# Altium footprint library PcbLib_ICs.PcbLib: 317 footprints (part 24 of 24)
Each footprint in its own frame and in the unit in brackets; x right, y up, seen from the top. Pads: shape width x height; smd on the part's side, far side on the other; paste and mask are expansions set on the pad; w line width, h text height; cw(c..) or ccw(c..) is an arc to the next point about the centre after c.
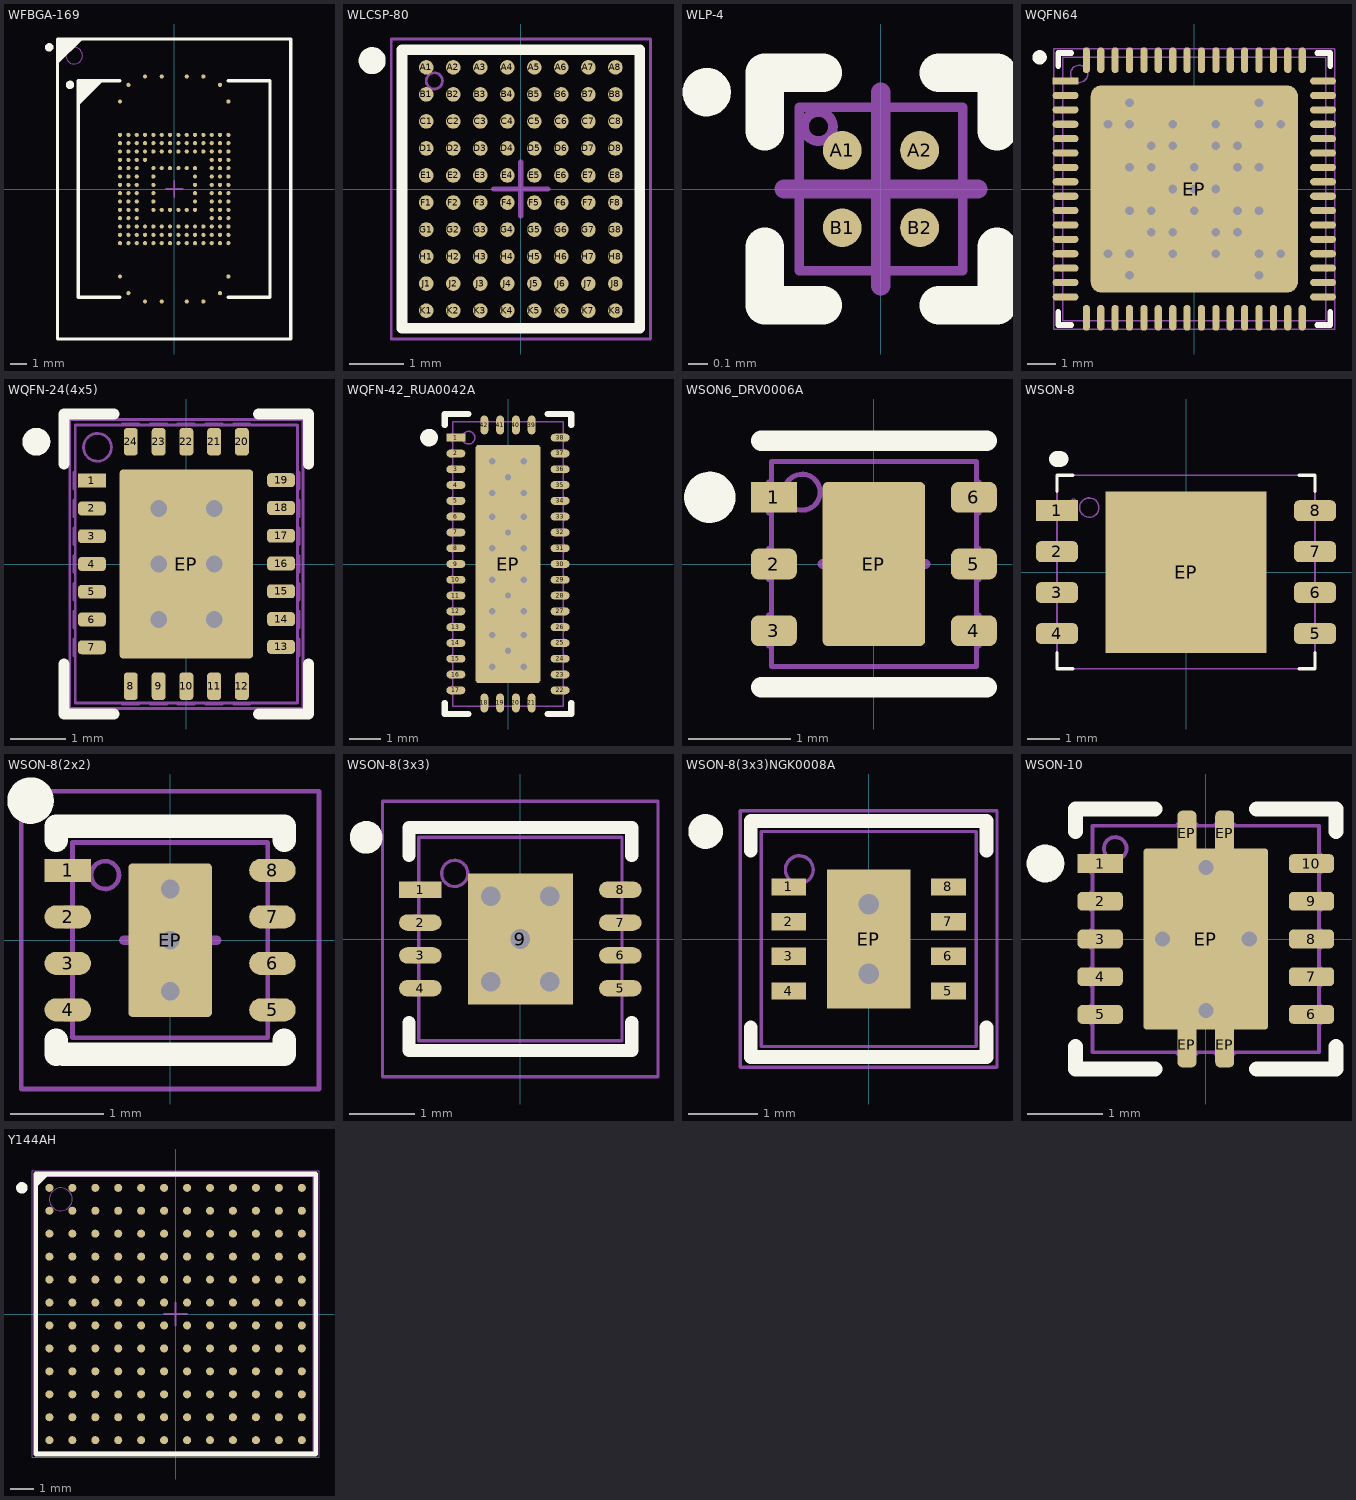
[diagram p23: the footprints below, top view; thin cyan lines are the x and y axes]

## WFBGA-169 [mm] "WFBGA-169, 169-Leads, Body 11.00x11.00mmx3.50mm, Pitch 0.50mm"
height 3.5
pads (169):
  round 0.25 smd mask+0.05: A4(-1.75,6.75) A6(-0.75,6.75) A9(0.75,6.75) A11(1.75,6.75) AA1(-3.25,-3.25) AA2(-2.75,-3.25) AA3(-2.25,-3.25) AA4(-1.75,-3.25) AA5(-1.25,-3.25) AA6(-0.75,-3.25) AA7(-0.25,-3.25) AA8(0.25,-3.25) AA9(0.75,-3.25) AA10(1.25,-3.25) AA11(1.75,-3.25) AA12(2.25,-3.25) AA13(2.75,-3.25) AA14(3.25,-3.25) AE1(-3.25,-5.25) AE14(3.25,-5.25) AG2(-2.75,-6.25) AG13(2.75,-6.25) AH4(-1.75,-6.75) AH6(-0.75,-6.75) AH9(0.75,-6.75) AH11(1.75,-6.75) B2(-2.75,6.25) B13(2.75,6.25) D1(-3.25,5.25) D14(3.25,5.25) H1(-3.25,3.25) H2(-2.75,3.25) H3(-2.25,3.25) H4(-1.75,3.25) H5(-1.25,3.25) H6(-0.75,3.25) H7(-0.25,3.25) H8(0.25,3.25) H9(0.75,3.25) H10(1.25,3.25) H11(1.75,3.25) H12(2.25,3.25) H13(2.75,3.25) H14(3.25,3.25) J1(-3.25,2.75) J2(-2.75,2.75) J3(-2.25,2.75) J4(-1.75,2.75) J5(-1.25,2.75) J6(-0.75,2.75) J7(-0.25,2.75) J8(0.25,2.75) J9(0.75,2.75) J10(1.25,2.75) J11(1.75,2.75) J12(2.25,2.75) J13(2.75,2.75) J14(3.25,2.75) K1(-3.25,2.25) K2(-2.75,2.25) K3(-2.25,2.25) K4(-1.75,2.25) K5(-1.25,2.25) K6(-0.75,2.25) K7(-0.25,2.25) K8(0.25,2.25) K9(0.75,2.25) K10(1.25,2.25) K11(1.75,2.25) K12(2.25,2.25) K13(2.75,2.25) K14(3.25,2.25) L1(-3.25,1.75) L2(-2.75,1.75) L3(-2.25,1.75) L4(-1.75,1.75) L12(2.25,1.75) L13(2.75,1.75) L14(3.25,1.75) M1(-3.25,1.25) M2(-2.75,1.25) M3(-2.25,1.25) M5(-1.25,1.25) M6(-0.75,1.25) M7(-0.25,1.25) M8(0.25,1.25) M9(0.75,1.25) M10(1.25,1.25) M12(2.25,1.25) M13(2.75,1.25) M14(3.25,1.25) N1(-3.25,0.75) N2(-2.75,0.75) N3(-2.25,0.75) N5(-1.25,0.75) N10(1.25,0.75) N12(2.25,0.75) N13(2.75,0.75) N14(3.25,0.75) P1(-3.25,0.25) P2(-2.75,0.25) P3(-2.25,0.25) P5(-1.25,0.25) P10(1.25,0.25) P12(2.25,0.25) P13(2.75,0.25) P14(3.25,0.25) R1(-3.25,-0.25) R2(-2.75,-0.25) R3(-2.25,-0.25) R5(-1.25,-0.25) R10(1.25,-0.25) R12(2.25,-0.25) R13(2.75,-0.25) R14(3.25,-0.25) T1(-3.25,-0.75) T2(-2.75,-0.75) T3(-2.25,-0.75) T5(-1.25,-0.75) T10(1.25,-0.75) T12(2.25,-0.75) T13(2.75,-0.75) T14(3.25,-0.75) U1(-3.25,-1.25) U2(-2.75,-1.25) U3(-2.25,-1.25) U5(-1.25,-1.25) U6(-0.75,-1.25) U7(-0.25,-1.25) U8(0.25,-1.25) U9(0.75,-1.25) U10(1.25,-1.25) U12(2.25,-1.25) U13(2.75,-1.25) U14(3.25,-1.25) V1(-3.25,-1.75) V2(-2.75,-1.75) V3(-2.25,-1.75) V12(2.25,-1.75) V13(2.75,-1.75) V14(3.25,-1.75) W1(-3.25,-2.25) W2(-2.75,-2.25) W3(-2.25,-2.25) W4(-1.75,-2.25) W5(-1.25,-2.25) W6(-0.75,-2.25) W7(-0.25,-2.25) W8(0.25,-2.25) W9(0.75,-2.25) W10(1.25,-2.25) W11(1.75,-2.25) W12(2.25,-2.25) W13(2.75,-2.25) W14(3.25,-2.25) Y1(-3.25,-2.75) Y2(-2.75,-2.75) Y3(-2.25,-2.75) Y4(-1.75,-2.75) Y5(-1.25,-2.75) Y6(-0.75,-2.75) Y7(-0.25,-2.75) Y8(0.25,-2.75) Y9(0.75,-2.75) Y10(1.25,-2.75) Y11(1.75,-2.75) Y12(2.25,-2.75) Y13(2.75,-2.75) Y14(3.25,-2.75)
Top Overlay:
  circle w0.25: c-7.5,8.5 r0.125
  circle w0.25: c-6.25,6.25 r0.125
  region: -5.75,6.5 -5.75,5 -4.25,6.5
  region: -7,9 -7,7.5 -5.5,9
  lines w0.2: -3.25,-6.5 -5.75,-6.5 -5.75,6.5 -3.25,6.5 ; 3.25,-6.5 5.75,-6.5 5.75,6.5 3.25,6.5 ; -7,-9 7,-9 7,9 -7,9 -7,-9
Top Assy:
  circle w0.05: c-6,8 r0.5
  lines w0.05: -7,-9 -7,9 7,9 7,-9 -7,-9
  text ".Designator" at -2.579,-0.349 h1.5
Top Text:
  lines w0.1: -0.5,0 0.5,0 ; 0,-0.5 0,0.5
3D body "WFBGA-169.STEP": height 1, standoff 0, extent -7,-9 7,9

## WLCSP-80 [mm] "WLCSP-80 package with 0.5mm pitch (Analog Devices Package Option CB-80-5 )"
height 0.66
pads (80):
  round 0.27 smd paste+0 mask+0.08: A1(-1.75,2.25) A2(-1.25,2.25) A3(-0.75,2.25) A4(-0.25,2.25) A5(0.25,2.25) A6(0.75,2.25) A7(1.25,2.25) A8(1.75,2.25) B1(-1.75,1.75) B2(-1.25,1.75) B3(-0.75,1.75) B4(-0.25,1.75) B5(0.25,1.75) B6(0.75,1.75) B7(1.25,1.75) B8(1.75,1.75) C1(-1.75,1.25) C2(-1.25,1.25) C3(-0.75,1.25) C4(-0.25,1.25) C5(0.25,1.25) C6(0.75,1.25) C7(1.25,1.25) C8(1.75,1.25) D1(-1.75,0.75) D2(-1.25,0.75) D3(-0.75,0.75) D4(-0.25,0.75) D5(0.25,0.75) D6(0.75,0.75) D7(1.25,0.75) D8(1.75,0.75) E1(-1.75,0.25) E2(-1.25,0.25) E3(-0.75,0.25) E4(-0.25,0.25) E5(0.25,0.25) E6(0.75,0.25) E7(1.25,0.25) E8(1.75,0.25) F1(-1.75,-0.25) F2(-1.25,-0.25) F3(-0.75,-0.25) F4(-0.25,-0.25) F5(0.25,-0.25) F6(0.75,-0.25) F7(1.25,-0.25) F8(1.75,-0.25) G1(-1.75,-0.75) G2(-1.25,-0.75) G3(-0.75,-0.75) G4(-0.25,-0.75) G5(0.25,-0.75) G6(0.75,-0.75) G7(1.25,-0.75) G8(1.75,-0.75) H1(-1.75,-1.25) H2(-1.25,-1.25) H3(-0.75,-1.25) H4(-0.25,-1.25) H5(0.25,-1.25) H6(0.75,-1.25) H7(1.25,-1.25) H8(1.75,-1.25) J1(-1.75,-1.75) J2(-1.25,-1.75) J3(-0.75,-1.75) J4(-0.25,-1.75) J5(0.25,-1.75) J6(0.75,-1.75) J7(1.25,-1.75) J8(1.75,-1.75) K1(-1.75,-2.25) K2(-1.25,-2.25) K3(-0.75,-2.25) K4(-0.25,-2.25) K5(0.25,-2.25) K6(0.75,-2.25) K7(1.25,-2.25) K8(1.75,-2.25)
Top Overlay:
  circle w0.25: c-2.75,2.375 r0.125
  lines w0.2: -2.2,-2.575 2.2,-2.575 2.2,2.575 -2.2,2.575 -2.2,-2.575
Top Assy:
  circle w0.05: c-1.6,2 r0.15
  lines w0.05: -2.145,-2.52 2.145,-2.52 2.145,2.52 -2.145,2.52 -2.145,-2.52
  text ".Designator" at -3.443,-0.467 h2
Top Text:
  lines w0.05: -2.4,-2.775 2.4,-2.775 2.4,2.775 -2.4,2.775 -2.4,-2.775
  lines w0.1: -0.5,0 0.5,0 ; 0,-0.5 0,0.5
3D body "WLCSP-80.step": height 0.66, standoff 0, extent -2.145,-2.52 2.145,2.52

## WLP-4 [mm] "CLG400 Package for Zynq-7000 Series SoC"
height 1.6
pads (4):
  round 0.2 smd paste+0 mask+0.05: A1(-0.2,0.2) A2(0.2,0.2) B1(-0.2,-0.2) B2(0.2,-0.2)
Top Overlay:
  circle w0.15: c-0.9,0.5 r0.05
  lines w0.2: -0.6,-0.3 -0.6,-0.6 -0.3,-0.6 ; -0.6,0.3 -0.6,0.6 -0.3,0.6 ; 0.3,-0.6 0.6,-0.6 0.6,-0.3 ; 0.3,0.6 0.6,0.6 0.6,0.3
Top Assy:
  circle w0.05: c-0.322,0.323 r0.075
  lines w0.05: -0.422,-0.422 -0.422,0.423 0.423,0.423 0.423,-0.422 -0.422,-0.422
  text ".Designator" at -1.204,-0.163 h0.7
Top Text:
  lines w0.1: -0.5,0 0.5,0 ; 0,-0.5 0,0.5
3D body "WLP-4.STEP": height 0.31, standoff -0.04, extent -0.422,-0.422 0.422,0.422

## WQFN64 [mm] "QFN64 9mm x 9mm, 0.5mm pitch, EPAD 7.2x7.2mm"
height 1
pads (65):
  rect 0.9x0.25 smd paste+0 mask+0.05: 1(-4.475,3.75)
  oval 0.9x0.25 smd paste+0 mask+0.05: 2(-4.475,3.25) 3(-4.475,2.75) 4(-4.475,2.25) 5(-4.475,1.75) 6(-4.475,1.25) 7(-4.475,0.75) 8(-4.475,0.25) 9(-4.475,-0.25) 10(-4.475,-0.75) 11(-4.475,-1.25) 12(-4.475,-1.75) 13(-4.475,-2.25) 14(-4.475,-2.75) 15(-4.475,-3.25) 16(-4.475,-3.75) 33(4.475,-3.75) 34(4.475,-3.25) 35(4.475,-2.75) 36(4.475,-2.25) 37(4.475,-1.75) 38(4.475,-1.25) 39(4.475,-0.75) 40(4.475,-0.25) 41(4.475,0.25) 42(4.475,0.75) 43(4.475,1.25) 44(4.475,1.75) 45(4.475,2.25) 46(4.475,2.75) 47(4.475,3.25) 48(4.475,3.75)
  oval 0.25x0.9 smd paste+0 mask+0.05: 17(-3.75,-4.475) 18(-3.25,-4.475) 19(-2.75,-4.475) 20(-2.25,-4.475) 21(-1.75,-4.475) 22(-1.25,-4.475) 23(-0.75,-4.475) 24(-0.25,-4.475) 25(0.25,-4.475) 26(0.75,-4.475) 27(1.25,-4.475) 28(1.75,-4.475) 29(2.25,-4.475) 30(2.75,-4.475) 31(3.25,-4.475) 32(3.75,-4.475) 49(3.75,4.475) 50(3.25,4.475) 51(2.75,4.475) 52(2.25,4.475) 53(1.75,4.475) 54(1.25,4.475) 55(0.75,4.475) 56(0.25,4.475) 57(-0.25,4.475) 58(-0.75,4.475) 59(-1.25,4.475) 60(-1.75,4.475) 61(-2.25,4.475) 62(-2.75,4.475) 63(-3.25,4.475) 64(-3.75,4.475)
  rrect10% 7.2x7.2 smd paste-50 mask+0.05: EP(0,0)
via -3,-2.25 diameter 0.7 hole 0.3
via -2.25,-3 diameter 0.7 hole 0.3
via 2.25,-3 diameter 0.7 hole 0.3
via 3,-2.25 diameter 0.7 hole 0.3
via 3,2.25 diameter 0.7 hole 0.3
via 2.25,3 diameter 0.7 hole 0.3
via -2.25,3 diameter 0.7 hole 0.3
via -3,2.25 diameter 0.7 hole 0.3
via -1.5,1.5 diameter 0.7 hole 0.3
via -0.75,1.5 diameter 0.7 hole 0.3
via 0.75,1.5 diameter 0.7 hole 0.3
via 1.5,0.75 diameter 0.7 hole 0.3
via 1.5,-0.75 diameter 0.7 hole 0.3
via 0.75,-1.5 diameter 0.7 hole 0.3
via -0.75,-1.5 diameter 0.7 hole 0.3
via 0,0 diameter 0.7 hole 0.3
via 1.5,1.5 diameter 0.7 hole 0.3
via 2.25,2.25 diameter 0.7 hole 0.3
via 0.75,2.25 diameter 0.7 hole 0.3
via 2.25,0.75 diameter 0.7 hole 0.3
via 1.5,-1.5 diameter 0.7 hole 0.3
via 2.25,-2.25 diameter 0.7 hole 0.3
via 2.25,-0.75 diameter 0.7 hole 0.3
via 0.75,-2.25 diameter 0.7 hole 0.3
via -1.5,-1.5 diameter 0.7 hole 0.3
via -2.25,-2.25 diameter 0.7 hole 0.3
via -0.75,-2.25 diameter 0.7 hole 0.3
via -2.25,-0.75 diameter 0.7 hole 0.3
via -2.25,2.25 diameter 0.7 hole 0.3
via -0.75,2.25 diameter 0.7 hole 0.3
via -2.25,0.75 diameter 0.7 hole 0.3
via -1.5,-0.75 diameter 0.7 hole 0.3
via -1.5,0.75 diameter 0.7 hole 0.3
via -0.75,0 diameter 0.7 hole 0.3
via 0,0.75 diameter 0.7 hole 0.3
via 0.75,0 diameter 0.7 hole 0.3
via 0,-0.75 diameter 0.7 hole 0.3
Top Overlay:
  circle w0.25: c-5.375,4.575 r0.125
  lines w0.2: -4.725,-4.275 -4.725,-4.725 -4.275,-4.725 ; -4.725,4.275 -4.725,4.725 -4.275,4.725 ; 4.275,-4.725 4.725,-4.725 4.725,-4.275 ; 4.275,4.725 4.725,4.725 4.725,4.275
Top Paste:
  rectangle: 2.5,-3.1 3.1,-2.5
  rectangle: 1.7,-3.1 2.3,-2.5
  rectangle: 0.9,-3.1 1.5,-2.5
  rectangle: 2.5,-2.3 3.1,-1.7
  rectangle: 1.7,-2.3 2.3,-1.7
  rectangle: 0.9,-2.3 1.5,-1.7
  rectangle: 2.5,-1.5 3.1,-0.9
  rectangle: 1.7,-1.5 2.3,-0.9
  rectangle: 0.9,-1.5 1.5,-0.9
  rectangle: 2.5,0.9 3.1,1.5
  rectangle: 1.7,0.9 2.3,1.5
  rectangle: 0.9,0.9 1.5,1.5
  rectangle: 2.5,1.7 3.1,2.3
  rectangle: 1.7,1.7 2.3,2.3
  rectangle: 0.9,1.7 1.5,2.3
  rectangle: 2.5,2.5 3.1,3.1
  rectangle: 1.7,2.5 2.3,3.1
  rectangle: 0.9,2.5 1.5,3.1
  region: -2.5,3.1 -3.1,3.1 -3.1,2.5 -2.5,2.5
  region: -1.7,3.1 -2.3,3.1 -2.3,2.5 -1.7,2.5
  region: -0.9,3.1 -1.5,3.1 -1.5,2.5 -0.9,2.5
  region: -2.5,2.3 -3.1,2.3 -3.1,1.7 -2.5,1.7
  region: -1.7,2.3 -2.3,2.3 -2.3,1.7 -1.7,1.7
  region: -0.9,2.3 -1.5,2.3 -1.5,1.7 -0.9,1.7
  region: -2.5,1.5 -3.1,1.5 -3.1,0.9 -2.5,0.9
  region: -1.7,1.5 -2.3,1.5 -2.3,0.9 -1.7,0.9
  region: -0.9,1.5 -1.5,1.5 -1.5,0.9 -0.9,0.9
  region: -2.5,-2.5 -3.1,-2.5 -3.1,-3.1 -2.5,-3.1
  region: -1.7,-2.5 -2.3,-2.5 -2.3,-3.1 -1.7,-3.1
  region: -0.9,-2.5 -1.5,-2.5 -1.5,-3.1 -0.9,-3.1
  region: -2.5,-1.7 -3.1,-1.7 -3.1,-2.3 -2.5,-2.3
  region: -1.7,-1.7 -2.3,-1.7 -2.3,-2.3 -1.7,-2.3
  region: -0.9,-1.7 -1.5,-1.7 -1.5,-2.3 -0.9,-2.3
  region: -2.5,-0.9 -3.1,-0.9 -3.1,-1.5 -2.5,-1.5
  region: -1.7,-0.9 -2.3,-0.9 -2.3,-1.5 -1.7,-1.5
  region: -0.9,-0.9 -1.5,-0.9 -1.5,-1.5 -0.9,-1.5
  region: -2.5,-0.1 -3.1,-0.1 -3.1,-0.7 -2.5,-0.7
  region: -1.7,-0.1 -2.3,-0.1 -2.3,-0.7 -1.7,-0.7
  region: -0.9,-0.1 -1.5,-0.1 -1.5,-0.7 -0.9,-0.7
  region: -0.1,2.5 -0.1,3.1 -0.7,3.1 -0.7,2.5
  region: -0.1,1.7 -0.1,2.3 -0.7,2.3 -0.7,1.7
  region: -0.1,0.9 -0.1,1.5 -0.7,1.5 -0.7,0.9
  rectangle: 2.5,0.1 3.1,0.7
  rectangle: 1.7,0.1 2.3,0.7
  rectangle: 0.9,0.1 1.5,0.7
  region: -0.7,-2.5 -0.7,-3.1 -0.1,-3.1 -0.1,-2.5
  region: -0.7,-1.7 -0.7,-2.3 -0.1,-2.3 -0.1,-1.7
  region: -0.7,-0.9 -0.7,-1.5 -0.1,-1.5 -0.1,-0.9
  region: 0.1,-2.5 0.1,-3.1 0.7,-3.1 0.7,-2.5
  region: 0.1,-1.7 0.1,-2.3 0.7,-2.3 0.7,-1.7
  region: 0.1,-0.9 0.1,-1.5 0.7,-1.5 0.7,-0.9
  rectangle: 2.5,-0.7 3.1,-0.1
  rectangle: 1.7,-0.7 2.3,-0.1
  rectangle: 0.9,-0.7 1.5,-0.1
  region: 0.7,2.5 0.7,3.1 0.1,3.1 0.1,2.5
  region: 0.7,1.7 0.7,2.3 0.1,2.3 0.1,1.7
  region: 0.7,0.9 0.7,1.5 0.1,1.5 0.1,0.9
  region: -2.5,0.7 -3.1,0.7 -3.1,0.1 -2.5,0.1
  region: -1.7,0.7 -2.3,0.7 -2.3,0.1 -1.7,0.1
  region: -0.9,0.7 -1.5,0.7 -1.5,0.1 -0.9,0.1
  region: 0.1,-0.1 0.1,-0.7 0.7,-0.7 0.7,-0.1
  region: -0.1,-0.1 -0.7,-0.1 -0.7,-0.7 -0.1,-0.7
  rectangle: 0.1,0.1 0.7,0.7
  region: -0.1,0.7 -0.7,0.7 -0.7,0.1 -0.1,0.1
Bottom Solder:
  region: -3.75,3.75 -1,3.75 0,2.75 1,3.75 3.75,3.75 3.75,1 2.75,0 3.75,-1 3.75,-3.75 1,-3.75 0,-2.75 -1,-3.75 -3.75,-3.75 -3.75,-1 -2.75,0 -3.75,1
Top Assy:
  drawing of 197 lines, arcs and shapes, not listed
  text ".Designator" at -3.443,-0.467 h2
Top Text:
  lines w0.05: -4.875,-4.875 -4.875,4.875 4.875,4.875 4.875,-4.875 -4.875,-4.875
  lines w0.1: -0.5,0 0.5,0 ; 0,-0.5 0,0.5
3D body "QFN64.step": height 1, standoff 0, extent -4.655,-4.655 4.655,4.655

## WQFN-24(4x5) [mm] "WQFN-24 package 4x5mm with 0.5mm pitch"
height 0.75
pads (25):
  rect 0.5x0.25 smd paste+0 mask+0.05: 1(-1.7,1.5)
  rrect50% 0.5x0.25 smd paste+0 mask+0.05: 2(-1.7,1) 3(-1.7,0.5) 4(-1.7,0) 5(-1.7,-0.5) 6(-1.7,-1) 7(-1.7,-1.5) 13(1.704,-1.491) 14(1.704,-0.991) 15(1.704,-0.491) 16(1.704,0.009) 17(1.704,0.509) 18(1.704,1.009) 19(1.704,1.509)
  rrect50% 0.25x0.5 smd paste+0 mask+0.05: 8(-1,-2.2) 9(-0.5,-2.2) 10(0,-2.2) 11(0.5,-2.2) 12(1,-2.2) 20(1,2.2) 21(0.5,2.2) 22(0,2.2) 23(-0.5,2.2) 24(-1,2.2)
  rrect5% 2.4x3.4 smd paste-10 mask+0.05: EP(0,0)
via -0.5,-1 diameter 0.7 hole 0.3
via 0.5,-1 diameter 0.7 hole 0.3
via 0.5,1 diameter 0.7 hole 0.3
via -0.5,1 diameter 0.7 hole 0.3
via 0.5,0 diameter 0.7 hole 0.3
via -0.5,0 diameter 0.7 hole 0.3
Top Overlay:
  circle w0.25: c-2.7,2.2 r0.125
  lines w0.2: -2.2,-1.8 -2.2,-2.7 -1.3,-2.7 ; -2.2,1.8 -2.2,2.7 -1.3,2.7 ; 1.3,-2.7 2.2,-2.7 2.2,-1.8 ; 1.3,2.7 2.2,2.7 2.2,1.8
Top Paste:
  rectangle: -0.25,0.45 0.25,0.95
  rectangle: 0.45,0.45 0.95,0.95
  region: -0.45,0.95 -0.95,0.95 -0.95,0.45 -0.45,0.45
  rectangle: -0.25,1.15 0.25,1.65
  rectangle: 0.45,1.15 0.95,1.65
  region: -0.45,1.65 -0.95,1.65 -0.95,1.15 -0.45,1.15
  region: 0.25,0.25 -0.25,0.25 -0.25,-0.25 0.25,-0.25
  region: -0.45,0.25 -0.95,0.25 -0.95,-0.25 -0.45,-0.25
  rectangle: 0.45,-0.25 0.95,0.25
  region: 0.25,-0.45 -0.25,-0.45 -0.25,-0.95 0.25,-0.95
  region: -0.45,-0.45 -0.95,-0.45 -0.95,-0.95 -0.45,-0.95
  rectangle: 0.45,-0.95 0.95,-0.45
  region: 0.25,-1.15 -0.25,-1.15 -0.25,-1.65 0.25,-1.65
  region: -0.45,-1.15 -0.95,-1.15 -0.95,-1.65 -0.45,-1.65
  rectangle: 0.45,-1.65 0.95,-1.15
Bottom Solder:
  region: -1.2,1.7 -0.275,1.7 0,1.425 0.275,1.7 1.2,1.7 1.2,0.3 0.9,0 1.2,-0.3 1.2,-1.7 0.275,-1.7 0,-1.425 -0.275,-1.7 -1.2,-1.7 -1.2,-0.3 -0.9,0 -1.2,0.3
Top Assy:
  circle w0.05: c-1.6,2.1 r0.25
  lines w0.05: -2.015,-1.65 -2.025,-1.65 -2.025,-1.35 -2.015,-1.35 ; -2.015,-1.15 -2.025,-1.15 -2.025,-0.85 -2.015,-0.85 ; -2.015,-0.65 -2.025,-0.65 -2.025,-0.35 -2.015,-0.35 ; -2.015,-0.15 -2.025,-0.15 -2.025,0.15 -2.015,0.15 ; -2.015,0.35 -2.025,0.35 -2.025,0.65 -2.015,0.65 ; -2.015,0.85 -2.025,0.85 -2.025,1.15 -2.015,1.15 ; -2.015,1.35 -2.025,1.35 -2.025,1.65 -2.015,1.65 ; -1.153,-2.51 -1.153,-2.52 -0.853,-2.52 -0.853,-2.51 ; -1.153,2.51 -1.153,2.52 -0.853,2.52 -0.853,2.51 ; -0.653,-2.51 -0.653,-2.52 -0.353,-2.52 -0.353,-2.51 ; -0.653,2.51 -0.653,2.52 -0.353,2.52 -0.353,2.51 ; -0.153,-2.51 -0.153,-2.52 0.147,-2.52 0.147,-2.51 ; -0.153,2.51 -0.153,2.52 0.147,2.52 0.147,2.51 ; 0.347,-2.51 0.347,-2.52 0.647,-2.52 0.647,-2.51 ; 0.347,2.51 0.347,2.52 0.647,2.52 0.647,2.51 ; 0.847,-2.51 0.847,-2.52 1.147,-2.52 1.147,-2.51 ; 0.847,2.51 0.847,2.52 1.147,2.52 1.147,2.51 ; 2.015,-1.65 2.025,-1.65 2.025,-1.35 2.015,-1.35 ; 2.015,-1.15 2.025,-1.15 2.025,-0.85 2.015,-0.85 ; 2.015,-0.65 2.025,-0.65 2.025,-0.35 2.015,-0.35 ; 2.015,-0.15 2.025,-0.15 2.025,0.15 2.015,0.15 ; 2.015,0.35 2.025,0.35 2.025,0.65 2.015,0.65 ; 2.015,0.85 2.025,0.85 2.025,1.15 2.015,1.15 ; 2.015,1.35 2.025,1.35 2.025,1.65 2.015,1.65 ; -2,-2.5 -2,2.5 2,2.5 2,-2.5 -2,-2.5
  text ".Designator" at 0.467,-3.443 h2
Top Text:
  lines w0.05: -2.1,-2.6 -2.1,2.6 2.1,2.6 2.1,-2.6 -2.1,-2.6
  lines w0.1: -0.5,0 0.5,0 ; 0,-0.5 0,0.5
3D body "WQFN-24(4x5).STEP": height 0.87, standoff 0, extent -2.01,-2.51 2.01,2.51

## WQFN-42_RUA0042A [mm] "WQFN-42 Package, TI case style RUA0042A"
height 0.75
pads (43):
  rect 0.6x0.25 smd mask+0.05: 1(-1.65,4)
  oval 0.6x0.25 smd mask+0.05: 2(-1.65,3.5) 3(-1.65,3) 4(-1.65,2.5) 5(-1.65,2) 6(-1.65,1.5) 7(-1.65,1) 8(-1.65,0.5) 9(-1.65,0) 10(-1.65,-0.5) 11(-1.65,-1) 12(-1.65,-1.5) 13(-1.65,-2) 14(-1.65,-2.5) 15(-1.65,-3) 16(-1.65,-3.5) 17(-1.65,-4) 22(1.65,-4) 23(1.65,-3.5) 24(1.65,-3) 25(1.65,-2.5) 26(1.65,-2) 27(1.65,-1.5) 28(1.65,-1) 29(1.65,-0.5) 30(1.65,0) 31(1.65,0.5) 32(1.65,1) 33(1.65,1.5) 34(1.65,2) 35(1.65,2.5) 36(1.65,3) 37(1.65,3.5) 38(1.65,4)
  oval 0.25x0.6 smd mask+0.05: 18(-0.75,-4.4) 19(-0.25,-4.4) 20(0.25,-4.4) 21(0.75,-4.4) 39(0.75,4.4) 40(0.25,4.4) 41(-0.25,4.4) 42(-0.75,4.4)
  rrect10% 2.05x7.55 smd paste-3 mask+0.05: EP(0,0)
via -0.5,3.25 diameter 0.5 hole 0.2
via 0.5,3.25 diameter 0.5 hole 0.2
via -0.5,2.25 diameter 0.5 hole 0.2
via 0.5,2.25 diameter 0.5 hole 0.2
via 0,2.75 diameter 0.5 hole 0.2
via -0.5,-2.25 diameter 0.5 hole 0.2
via 0.5,-2.25 diameter 0.5 hole 0.2
via -0.5,-3.25 diameter 0.5 hole 0.2
via 0.5,-3.25 diameter 0.5 hole 0.2
via 0,-2.75 diameter 0.5 hole 0.2
via -0.5,-0.5 diameter 0.5 hole 0.2
via 0.5,-0.5 diameter 0.5 hole 0.2
via -0.5,-1.5 diameter 0.5 hole 0.2
via 0.5,-1.5 diameter 0.5 hole 0.2
via 0,-1 diameter 0.5 hole 0.2
via -0.5,1.5 diameter 0.5 hole 0.2
via 0.5,1.5 diameter 0.5 hole 0.2
via -0.5,0.5 diameter 0.5 hole 0.2
via 0.5,0.5 diameter 0.5 hole 0.2
via 0,1 diameter 0.5 hole 0.2
Top Overlay:
  circle w0.3: c-2.5,4 r0.13
  lines w0.2: -2,-4.4 -2,-4.75 -1.25,-4.75 ; -2,4.4 -2,4.75 -1.25,4.75 ; 1.25,-4.75 2,-4.75 2,-4.4 ; 1.25,4.75 2,4.75 2,4.4
Top Paste:
  region: 0.25,-3.4 0.25,-2.9 -0.25,-2.9 -0.25,-3.4
  region: -0.45,-3.4 -0.45,-2.9 -0.95,-2.9 -0.95,-3.4
  region: 0.95,-3.4 0.95,-2.9 0.45,-2.9 0.45,-3.4
  region: -0.25,3.4 -0.25,2.9 0.25,2.9 0.25,3.4
  region: 0.45,3.4 0.45,2.9 0.95,2.9 0.95,3.4
  region: -0.95,3.4 -0.95,2.9 -0.45,2.9 -0.45,3.4
  region: 0.95,-0.6 0.95,-0.1 0.45,-0.1 0.45,-0.6
  region: 0.25,-0.6 0.25,-0.1 -0.25,-0.1 -0.25,-0.6
  region: -0.25,0.6 -0.25,0.1 0.25,0.1 0.25,0.6
  region: 0.45,0.6 0.45,0.1 0.95,0.1 0.95,0.6
  region: 0.95,0.8 0.95,1.3 0.45,1.3 0.45,0.8
  region: 0.25,0.8 0.25,1.3 -0.25,1.3 -0.25,0.8
  region: -0.25,2 -0.25,1.5 0.25,1.5 0.25,2
  region: 0.45,2 0.45,1.5 0.95,1.5 0.95,2
  region: 0.95,-2 0.95,-1.5 0.45,-1.5 0.45,-2
  region: 0.25,-2 0.25,-1.5 -0.25,-1.5 -0.25,-2
  region: -0.25,-0.8 -0.25,-1.3 0.25,-1.3 0.25,-0.8
  region: 0.45,-0.8 0.45,-1.3 0.95,-1.3 0.95,-0.8
  region: -0.95,0.6 -0.95,0.1 -0.45,0.1 -0.45,0.6
  region: -0.45,-0.6 -0.45,-0.1 -0.95,-0.1 -0.95,-0.6
  region: -0.95,-0.8 -0.95,-1.3 -0.45,-1.3 -0.45,-0.8
  region: -0.45,-2 -0.45,-1.5 -0.95,-1.5 -0.95,-2
  region: -0.95,2 -0.95,1.5 -0.45,1.5 -0.45,2
  region: -0.45,0.8 -0.45,1.3 -0.95,1.3 -0.95,0.8
  region: -0.25,2.7 -0.25,2.2 0.25,2.2 0.25,2.7
  region: 0.45,2.7 0.45,2.2 0.95,2.2 0.95,2.7
  region: -0.95,2.7 -0.95,2.2 -0.45,2.2 -0.45,2.7
  region: 0.95,-2.7 0.95,-2.2 0.45,-2.2 0.45,-2.7
  region: 0.25,-2.7 0.25,-2.2 -0.25,-2.2 -0.25,-2.7
  region: -0.45,-2.7 -0.45,-2.2 -0.95,-2.2 -0.95,-2.7
Bottom Solder:
  region: 0.25,4 0,3.75 -0.25,4 -1.25,4 -1.25,3 -1,2.75 -1.25,2.5 -1.25,1.25 -1,1 -1.25,0.75 -1.25,-0.75 -1,-1 -1.25,-1.25 -1.25,-2.5 -1,-2.75 -1.25,-3 -1.25,-4 -0.25,-4 0,-3.75 0.25,-4 1.25,-4 1.25,-3 1,-2.75 1.25,-2.5 1.25,-1.25 1,-1 1.25,-0.75 1.25,0.75 1,1 1.25,1.25 1.25,2.5 1,2.75 1.25,3 1.25,4
Top Assy:
  circle w0.05: c-1.25,4 r0.2
  lines w0.05: -1.75,-4.125 -1.775,-4.125 -1.775,-3.875 -1.75,-3.875 ; -1.75,-3.625 -1.775,-3.625 -1.775,-3.375 -1.75,-3.375 ; -1.75,-3.125 -1.775,-3.125 -1.775,-2.875 -1.75,-2.875 ; -1.75,-2.625 -1.775,-2.625 -1.775,-2.375 -1.75,-2.375 ; -1.75,-2.125 -1.775,-2.125 -1.775,-1.875 -1.75,-1.875 ; -1.75,-1.625 -1.775,-1.625 -1.775,-1.375 -1.75,-1.375 ; -1.75,-1.125 -1.775,-1.125 -1.775,-0.875 -1.75,-0.875 ; -1.75,-0.625 -1.775,-0.625 -1.775,-0.375 -1.75,-0.375 ; -1.75,-0.125 -1.775,-0.125 -1.775,0.125 -1.75,0.125 ; -1.75,0.375 -1.775,0.375 -1.775,0.625 -1.75,0.625 ; -1.75,0.875 -1.775,0.875 -1.775,1.125 -1.75,1.125 ; -1.75,1.375 -1.775,1.375 -1.775,1.625 -1.75,1.625 ; -1.75,1.875 -1.775,1.875 -1.775,2.125 -1.75,2.125 ; -1.75,2.375 -1.775,2.375 -1.775,2.625 -1.75,2.625 ; -1.75,2.875 -1.775,2.875 -1.775,3.125 -1.75,3.125 ; -1.75,3.375 -1.775,3.375 -1.775,3.625 -1.75,3.625 ; -1.75,3.875 -1.775,3.875 -1.775,4.125 -1.75,4.125 ; -0.875,-4.5 -0.875,-4.525 -0.625,-4.525 -0.625,-4.5 ; -0.875,4.5 -0.875,4.525 -0.625,4.525 -0.625,4.5 ; -0.375,-4.5 -0.375,-4.525 -0.125,-4.525 -0.125,-4.5 ; -0.375,4.5 -0.375,4.525 -0.125,4.525 -0.125,4.5 ; 0.125,-4.5 0.125,-4.525 0.375,-4.525 0.375,-4.5 ; 0.125,4.5 0.125,4.525 0.375,4.525 0.375,4.5 ; 0.625,-4.5 0.625,-4.525 0.875,-4.525 0.875,-4.5 ; 0.625,4.5 0.625,4.525 0.875,4.525 0.875,4.5 ; 1.75,-4.125 1.775,-4.125 1.775,-3.875 1.75,-3.875 ; 1.75,-3.625 1.775,-3.625 1.775,-3.375 1.75,-3.375 ; 1.75,-3.125 1.775,-3.125 1.775,-2.875 1.75,-2.875 ; 1.75,-2.625 1.775,-2.625 1.775,-2.375 1.75,-2.375 ; 1.75,-2.125 1.775,-2.125 1.775,-1.875 1.75,-1.875 ; 1.75,-1.625 1.775,-1.625 1.775,-1.375 1.75,-1.375 ; 1.75,-1.125 1.775,-1.125 1.775,-0.875 1.75,-0.875 ; 1.75,-0.625 1.775,-0.625 1.775,-0.375 1.75,-0.375 ; 1.75,-0.125 1.775,-0.125 1.775,0.125 1.75,0.125 ; 1.75,0.375 1.775,0.375 1.775,0.625 1.75,0.625 ; 1.75,0.875 1.775,0.875 1.775,1.125 1.75,1.125 ; 1.75,1.375 1.775,1.375 1.775,1.625 1.75,1.625 ; 1.75,1.875 1.775,1.875 1.775,2.125 1.75,2.125 ; 1.75,2.375 1.775,2.375 1.775,2.625 1.75,2.625 ; 1.75,2.875 1.775,2.875 1.775,3.125 1.75,3.125 ; 1.75,3.375 1.775,3.375 1.775,3.625 1.75,3.625 ; 1.75,3.875 1.775,3.875 1.775,4.125 1.75,4.125 ; -1.75,-4.5 1.75,-4.5 1.75,4.5 -1.75,4.5 -1.75,-4.5
  text ".Designator" at 0.467,-3.443 h2
Top Text:
  lines w0.1: -0.5,0 0.5,0 ; 0,-0.5 0,0.5
3D body "RUA0042A.STEP": height 0.8, standoff 0, extent -1.775,-4.525 1.775,4.525

## WSON6_DRV0006A [mm] "WSON6 case style DRV0006A TI"
height 0.8
pads (7):
  rect 0.45x0.3 smd mask+0.05: 1(-0.975,0.65)
  rrect50% 0.45x0.3 smd mask+0.05: 2(-0.975,0) 3(-0.975,-0.65) 4(0.975,-0.65) 5(0.975,0) 6(0.975,0.65)
  rrect10% 1x1.6 smd paste-3 mask+0.05: EP(0,0)
Top Overlay:
  circle w0.25: c-1.6,0.65 r0.125
  lines w0.2: -1.1,-1.2 1.1,-1.2 ; -1.1,1.2 1.1,1.2
Top Paste:
  rectangle: -0.5,-0.8 0.5,-0.1
  rectangle: -0.5,0.1 0.5,0.8
Top Assy:
  circle w0.05: c-0.7,0.7 r0.175
  lines w0.05: -1,-0.8 -1.025,-0.8 -1.025,-0.5 -1,-0.5 ; -1,-0.15 -1.025,-0.15 -1.025,0.15 -1,0.15 ; -1,0.5 -1.025,0.5 -1.025,0.8 -1,0.8 ; 1,-0.8 1.025,-0.8 1.025,-0.5 1,-0.5 ; 1,-0.15 1.025,-0.15 1.025,0.15 1,0.15 ; 1,0.5 1.025,0.5 1.025,0.8 1,0.8 ; -1,-1 -1,1 1,1 1,-1 -1,-1
  text ".Designator" at -2.579,-0.349 h1.5
Top Text:
  lines w0.1: -0.5,0 0.5,0 ; 0,-0.5 0,0.5
3D body "WSON-6.STEP": height 0.8, standoff 0, extent -1.025,-1 1.025,1

## WSON-8 [mm] "WSON-8, 8-Leads, Body 6,00x8,00mm, Pitch 1,27mm, Thermal Pad 4,90x4,75mm"
height 0.8
pads (9):
  rect 1.3x0.65 smd paste+0 mask+0.05: 1(-4,1.905)
  rrect50% 1.3x0.65 smd paste+0 mask+0.05: 2(-4,0.635) 3(-4,-0.635) 4(-4,-1.905) 5(4,-1.905) 6(4,-0.635) 7(4,0.635) 8(4,1.905)
  rect 5x5 smd paste-50 mask+0.05: EP(0,0)
Top Overlay:
  lines w0.1: -4,-2.495 -4,-2.995 -3.5,-2.995 ; -4,2.505 -4,3.005 -3.5,3.005 ; 3.5,-2.995 4,-2.995 4,-2.495 ; 3.5,3.005 4,3.005 4,2.505
  lines w0.5: -4,3.505 -3.9,3.505
Top Paste:
  region: -0.5,0.7 -1.1,0.7 -1.1,0.1 -0.5,0.1
  rectangle: -0.3,0.1 0.3,0.7
  region: -0.5,-0.1 -1.1,-0.1 -1.1,-0.7 -0.5,-0.7
  region: -0.3,-0.1 -0.3,-0.7 0.3,-0.7 0.3,-0.1
  region: 0.3,0.9 0.3,1.5 -0.3,1.5 -0.3,0.9
  rectangle: 0.5,-0.7 1.1,-0.1
  region: -0.3,-0.9 -0.3,-1.5 0.3,-1.5 0.3,-0.9
  region: -1.1,-0.9 -1.1,-1.5 -0.5,-1.5 -0.5,-0.9
  rectangle: 0.5,0.1 1.1,0.7
  region: -0.5,0.9 -0.5,1.5 -1.1,1.5 -1.1,0.9
  rectangle: 0.5,0.9 1.1,1.5
  rectangle: 0.5,-1.5 1.1,-0.9
  region: 0.3,1.7 0.3,2.3 -0.3,2.3 -0.3,1.7
  region: -0.5,1.7 -0.5,2.3 -1.1,2.3 -1.1,1.7
  rectangle: 0.5,1.7 1.1,2.3
  region: -0.3,-1.7 -0.3,-2.3 0.3,-2.3 0.3,-1.7
  region: 0.5,-1.7 0.5,-2.3 1.1,-2.3 1.1,-1.7
  region: -0.5,-1.7 -1.1,-1.7 -1.1,-2.3 -0.5,-2.3
  rectangle: 1.3,-0.7 1.9,-0.1
  rectangle: 1.3,0.1 1.9,0.7
  rectangle: 1.3,0.9 1.9,1.5
  rectangle: 1.3,-1.5 1.9,-0.9
  rectangle: 1.3,1.7 1.9,2.3
  region: 1.3,-1.7 1.3,-2.3 1.9,-2.3 1.9,-1.7
  region: -1.3,0.7 -1.9,0.7 -1.9,0.1 -1.3,0.1
  region: -1.3,-0.1 -1.9,-0.1 -1.9,-0.7 -1.3,-0.7
  region: -1.3,-0.9 -1.9,-0.9 -1.9,-1.5 -1.3,-1.5
  region: -1.3,1.5 -1.9,1.5 -1.9,0.9 -1.3,0.9
  region: -1.3,-1.7 -1.9,-1.7 -1.9,-2.3 -1.3,-2.3
  region: -1.3,1.7 -1.3,2.3 -1.9,2.3 -1.9,1.7
Top Solder:
  region: 2.6,2.605 -2.6,2.605 -2.6,-2.595 2.6,-2.595
Top Simple Assy:
  circle w0.013: c-3.487,2.192 r0.075
  circle w0.013: c-3.487,2.192 r0.07
Top Assy:
  circle w0.05: c-3,2 r0.3
  lines w0.05: -4,-2.2 -4.13,-2.2 -4.13,-1.61 -4,-1.61 ; -4,-0.93 -4.13,-0.93 -4.13,-0.34 -4,-0.34 ; -4,0.34 -4.13,0.34 -4.13,0.93 -4,0.93 ; -4,1.61 -4.13,1.61 -4.13,2.2 -4,2.2 ; 4,-2.2 4.13,-2.2 4.13,-1.61 4,-1.61 ; 4,-0.93 4.13,-0.93 4.13,-0.34 4,-0.34 ; 4,0.34 4.13,0.34 4.13,0.93 4,0.93 ; 4,1.61 4.13,1.61 4.13,2.2 4,2.2 ; -4,-3 -4,3 0,3 4,3 4,-3 0,-3 -4,-3
  text ".Designator" at -3.443,-0.467 h2
Top Text:
  lines w0.1: -0.5,0 0.5,0 ; 0,-0.5 0,0.5
3D body "User Library-WSON-8_6x8mm.STEP": height 0.81, standoff -0.07, extent -4,-2.995 4,3.005

## WSON-8(2x2) [mm] "WSON-8, 8-Leads, Body 2,00x2,00mm, Pitch 0,50mm, Thermal Pad 0,90x1,65mm, IPC Medium Density"
height 0.8
pads (9):
  rect 0.5x0.25 smd paste+0 mask+0.05: 1(-1.1,0.75)
  oval 0.5x0.25 smd paste+0 mask+0.05: 2(-1.1,0.25) 3(-1.1,-0.25) 4(-1.1,-0.75) 5(1.1,-0.75) 6(1.1,-0.25) 7(1.1,0.25) 8(1.1,0.75)
  rrect10% 0.9x1.65 smd paste-50 mask+0.05: EP(0,0)
via 0,-0.55 diameter 0.5 hole 0.2
via 0,0.55 diameter 0.5 hole 0.2
via 0,0 diameter 0.5 hole 0.2
Top Overlay:
  circle w0.25: c-1.5,1.5 r0.125
  lines w0.254: -1.225,-1.225 -1.225,-1.075 ; -1.225,1.075 -1.225,1.225 1.15,1.225 1.2,1.225 1.225,1.225 1.225,1.075 ; -1.15,-1.225 1.225,-1.225 1.225,-1.075
Top Paste:
  region: -0.25,-0.45 -0.25,-0.95 0.25,-0.95 0.25,-0.45
  region: 0.25,0.45 0.25,0.95 -0.25,0.95 -0.25,0.45
  region: 0.25,-0.25 0.25,0.25 -0.25,0.25 -0.25,-0.25
Bottom Solder:
  region: -0.7,0.85 0.7,0.85 0.7,0.2 0.45,0 0.7,-0.2 0.7,-0.85 -0.7,-0.85 -0.7,-0.2 -0.45,0 -0.7,0.2
Top Assy:
  circle w0.05: c-0.7,0.7 r0.15
  lines w0.05: -1.05,-0.85 -1.13,-0.85 -1.13,-0.65 -1.05,-0.65 ; -1.05,-0.35 -1.13,-0.35 -1.13,-0.15 -1.05,-0.15 ; -1.05,0.15 -1.13,0.15 -1.13,0.35 -1.05,0.35 ; -1.05,0.65 -1.13,0.65 -1.13,0.85 -1.05,0.85 ; 1.05,-0.85 1.13,-0.85 1.13,-0.65 1.05,-0.65 ; 1.05,-0.35 1.13,-0.35 1.13,-0.15 1.05,-0.15 ; 1.05,0.15 1.13,0.15 1.13,0.35 1.05,0.35 ; 1.05,0.65 1.13,0.65 1.13,0.85 1.05,0.85 ; -1.05,-1.05 1.05,-1.05 1.05,1.05 -1.05,1.05 -1.05,-1.05
  text ".Designator" at -1.719,-0.233 h1
Top Text:
  lines w0.05: -1.6,-1.6 1.6,-1.6 1.6,1.6 -1.6,1.6 -1.6,-1.6
  lines w0.1: -0.5,0 0.5,0 ; 0,-0.5 0,0.5
3D body "WSON-8(2x2).step": height 0.8, standoff 0, extent -1.1,-1.05 1.1,1.05

## WSON-8(3x3) [mm] "WSON-8, 8-Leads, Body 3.00x3.00mm, Pitch 0.50mm, Thermal Pad 1.60x2.00mm, IPC Medium Density"
height 0.8
pads (9):
  rect 0.65x0.25 smd paste+0 mask+0.05: 1(-1.525,0.75)
  oval 0.65x0.25 smd paste+0 mask+0.05: 2(-1.525,0.25) 3(-1.525,-0.25) 4(-1.525,-0.75) 5(1.525,-0.75) 6(1.525,-0.25) 7(1.525,0.25) 8(1.525,0.75)
  rect 1.6x2 smd paste-50 mask+0.05: 9(0,0)
via -0.45,-0.65 diameter 0.7 hole 0.3
via 0.45,-0.65 diameter 0.7 hole 0.3
via 0.45,0.65 diameter 0.7 hole 0.3
via -0.45,0.65 diameter 0.7 hole 0.3
via 0,0 diameter 0.7 hole 0.3
Top Overlay:
  circle w0.25: c-2.35,1.55 r0.125
  lines w0.2: -1.7,-1.275 -1.7,-1.7 0.3,-1.7 ; -1.7,1.275 -1.7,1.7 -0.275,1.7 1.7,1.7 1.7,1.275 ; 0.275,-1.7 1.7,-1.7 1.7,-1.275
Top Paste:
  region: -0.1,0.25 -0.6,0.25 -0.6,-0.25 -0.1,-0.25
  region: 0.6,0.25 0.1,0.25 0.1,-0.25 0.6,-0.25
  region: -0.1,0.45 -0.1,0.95 -0.6,0.95 -0.6,0.45
  region: 0.6,0.45 0.6,0.95 0.1,0.95 0.1,0.45
  region: -0.6,-0.45 -0.6,-0.95 -0.1,-0.95 -0.1,-0.45
  region: 0.1,-0.45 0.1,-0.95 0.6,-0.95 0.6,-0.45
Bottom Solder:
  region: -1,1.2 -0.25,1.2 0,1 0.25,1.2 1,1.2 1,0.25 0.8,-0.01 1,-0.25 1,-1.2 0.25,-1.2 0,-1 -0.25,-1.2 -1,-1.2 -1,-0.25 -0.8,-0.01 -1,0.25
Top Assy:
  circle w0.05: c-1,1 r0.2
  lines w0.05: -1.55,-0.85 -1.63,-0.85 -1.63,-0.65 -1.55,-0.65 ; -1.55,-0.35 -1.63,-0.35 -1.63,-0.15 -1.55,-0.15 ; -1.55,0.15 -1.63,0.15 -1.63,0.35 -1.55,0.35 ; -1.55,0.65 -1.63,0.65 -1.63,0.85 -1.55,0.85 ; 1.55,-0.85 1.63,-0.85 1.63,-0.65 1.55,-0.65 ; 1.55,-0.35 1.63,-0.35 1.63,-0.15 1.55,-0.15 ; 1.55,0.15 1.63,0.15 1.63,0.35 1.55,0.35 ; 1.55,0.65 1.63,0.65 1.63,0.85 1.55,0.85 ; -1.55,-1.55 1.55,-1.55 1.55,1.55 -1.55,1.55 -1.55,-1.55
  text ".Designator" at -1.719,-0.233 h1
Top Text:
  lines w0.05: -2.1,-2.1 2.1,-2.1 2.1,2.1 -2.1,2.1 -2.1,-2.1
  lines w0.1: -0.5,0 0.5,0 ; 0,-0.5 0,0.5
3D body "WSON-8(3x3).step": height 0.8, standoff 0, extent -1.56,-1.55 1.56,1.55

## WSON-8(3x3)NGK0008A [mm] "WSON-8, 8-Leads, Body 3.00x3.00mm, Pitch 0.50mm, Thermal Pad 1.60x2.00mm, IPC Medium Density"
height 0.8
pads (9):
  rect 0.5x0.25 smd paste+0 mask+0.05: 1(-1.15,0.75) 2(-1.15,0.25) 3(-1.15,-0.25) 4(-1.15,-0.75) 5(1.15,-0.75) 6(1.15,-0.25) 7(1.15,0.25) 8(1.15,0.75)
  rect 1.2x2 smd paste-50 mask+0.05: EP(0,0)
via 0,0.5 diameter 0.7 hole 0.3
via 0,-0.5 diameter 0.7 hole 0.3
Top Overlay:
  circle w0.25: c-2.35,1.55 r0.125
  lines w0.2: -1.7,-1.275 -1.7,-1.7 0.3,-1.7 ; -1.7,1.275 -1.7,1.7 -0.275,1.7 1.7,1.7 1.7,1.275 ; 0.275,-1.7 1.7,-1.7 1.7,-1.275
Top Paste:
  region: 0.1,-0.45 0.1,-0.95 0.6,-0.95 0.6,-0.45
  region: -0.6,-0.45 -0.6,-0.95 -0.1,-0.95 -0.1,-0.45
  region: 0.6,0.45 0.6,0.95 0.1,0.95 0.1,0.45
  region: -0.1,0.45 -0.1,0.95 -0.6,0.95 -0.6,0.45
  region: 0.6,0.25 0.1,0.25 0.1,-0.25 0.6,-0.25
  region: -0.1,0.25 -0.6,0.25 -0.6,-0.25 -0.1,-0.25
Bottom Solder:
  region: -0.801,1.15 -0.2,1.15 0,0.95 0.2,1.15 0.8,1.15 0.8,0.2 0.6,0 0.8,-0.2 0.8,-1.15 0.2,-1.15 0,-0.95 -0.2,-1.15 -0.8,-1.15 -0.8,-0.2 -0.6,0 -0.8,0.2
Top Assy:
  circle w0.05: c-1,1 r0.2
  lines w0.05: -1.55,-1.55 -1.55,1.55 1.55,1.55 1.55,-1.55 -1.55,-1.55
  text ".Designator" at -1.719,-0.233 h1
Top Text:
  lines w0.05: -1.85,-1.85 -1.85,1.85 1.85,1.85 1.85,-1.85 -1.85,-1.85
  lines w0.1: -0.5,0 0.5,0 ; 0,-0.5 0,0.5
3D body "WSON-8.STEP": height 0.81, standoff 0, extent -1.5,-1.51 1.5,1.51

## WSON-10 [mm] "WSON-10, TI case style DSC0010J"
height 0.8
pads (15):
  rect 0.6x0.25 smd paste+0 mask+0.05: 1(-1.4,1)
  rrect50% 0.6x0.25 smd paste+0 mask+0.05: 2(-1.4,0.5) 3(-1.4,0) 4(-1.4,-0.5) 5(-1.4,-1) 6(1.4,-1) 7(1.4,-0.5) 8(1.4,0) 9(1.4,0.5) 10(1.4,1)
  rrect50% 0.25x0.6 smd paste+0 mask+0.05: EP(-0.25,-1.4) EP(-0.25,1.4) EP(0.25,-1.4) EP(0.25,1.4)
  rrect5% 1.65x2.4 smd paste-10 mask+0.05: EP(0,0)
via 0.575,0 diameter 0.5 hole 0.2
via -0.575,0 diameter 0.5 hole 0.2
via 0,-0.95 diameter 0.5 hole 0.2
via 0,0.95 diameter 0.5 hole 0.2
Top Overlay:
  circle w0.25: c-2.125,1 r0.125
  lines w0.2: -1.725,-1.425 -1.725,-1.725 -0.675,-1.725 ; -1.725,1.425 -1.725,1.725 -0.675,1.725 ; 0.675,-1.725 1.725,-1.725 1.725,-1.425 ; 0.675,1.725 1.725,1.725 1.725,1.425
Top Paste:
  region: -0.6,-0.45 -0.6,-0.95 -0.1,-0.95 -0.1,-0.45
  region: -0.1,0.45 -0.1,0.95 -0.6,0.95 -0.6,0.45
  region: -0.1,-0.25 -0.1,0.25 -0.6,0.25 -0.6,-0.25
  region: 0.1,-0.45 0.1,-0.95 0.6,-0.95 0.6,-0.45
  region: 0.6,0.45 0.6,0.95 0.1,0.95 0.1,0.45
  region: 0.6,-0.25 0.6,0.25 0.1,0.25 0.1,-0.25
Top Assy:
  circle w0.05: c-1.2,1.2 r0.15
  lines w0.05: -1.5,-1.12 -1.52,-1.12 -1.52,-0.88 -1.5,-0.88 ; -1.5,-0.62 -1.52,-0.62 -1.52,-0.38 -1.5,-0.38 ; -1.5,-0.12 -1.52,-0.12 -1.52,0.12 -1.5,0.12 ; -1.5,0.38 -1.52,0.38 -1.52,0.62 -1.5,0.62 ; -1.5,0.88 -1.52,0.88 -1.52,1.12 -1.5,1.12 ; -0.375,-1.5 -0.375,-1.52 -0.125,-1.52 -0.125,-1.5 ; -0.375,1.5 -0.375,1.52 -0.125,1.52 -0.125,1.5 ; 0.125,-1.5 0.125,-1.52 0.375,-1.52 0.375,-1.5 ; 0.125,1.5 0.125,1.52 0.375,1.52 0.375,1.5 ; 1.5,-1.12 1.52,-1.12 1.52,-0.88 1.5,-0.88 ; 1.5,-0.62 1.52,-0.62 1.52,-0.38 1.5,-0.38 ; 1.5,-0.12 1.52,-0.12 1.52,0.12 1.5,0.12 ; 1.5,0.38 1.52,0.38 1.52,0.62 1.5,0.62 ; 1.5,0.88 1.52,0.88 1.52,1.12 1.5,1.12 ; -1.5,-1.5 1.5,-1.5 1.5,1.5 -1.5,1.5 -1.5,-1.5
  text ".Designator" at -3.443,-0.467 h2
Top Text:
  lines w0.1: -0.5,0 0.5,0 ; 0,-0.5 0,0.5
3D body "WSON-10.STEP": height 0.85, standoff 0, extent -1.52,-1.52 1.52,1.52

## Y144AH [mm] "BGA, 144-Leads, Body 12,00x12,00mmx1,34mm, Pitch 1,00mm"
height 1.34
pads (144):
  round 0.35 smd paste+0 mask+0.05: A1(-5.5,5.5) A2(-4.5,5.5) A3(-3.5,5.5) A4(-2.5,5.5) A5(-1.5,5.5) A6(-0.5,5.5) A7(0.5,5.5) A8(1.5,5.5) A9(2.5,5.5) A10(3.5,5.5) A11(4.5,5.5) A12(5.5,5.5) B1(-5.5,4.5) B2(-4.5,4.5) B3(-3.5,4.5) B4(-2.5,4.5) B5(-1.5,4.5) B6(-0.5,4.5) B7(0.5,4.5) B8(1.5,4.5) B9(2.5,4.5) B10(3.5,4.5) B11(4.5,4.5) B12(5.5,4.5) C1(-5.5,3.5) C2(-4.5,3.5) C3(-3.5,3.5) C4(-2.5,3.5) C5(-1.5,3.5) C6(-0.5,3.5) C7(0.5,3.5) C8(1.5,3.5) C9(2.5,3.5) C10(3.5,3.5) C11(4.5,3.5) C12(5.5,3.5) D1(-5.5,2.5) D2(-4.5,2.5) D3(-3.5,2.5) D4(-2.5,2.5) D5(-1.5,2.5) D6(-0.5,2.5) D7(0.5,2.5) D8(1.5,2.5) D9(2.5,2.5) D10(3.5,2.5) D11(4.5,2.5) D12(5.5,2.5) E1(-5.5,1.5) E2(-4.5,1.5) E3(-3.5,1.5) E4(-2.5,1.5) E5(-1.5,1.5) E6(-0.5,1.5) E7(0.5,1.5) E8(1.5,1.5) E9(2.5,1.5) E10(3.5,1.5) E11(4.5,1.5) E12(5.5,1.5) F1(-5.5,0.5) F2(-4.5,0.5) F3(-3.5,0.5) F4(-2.5,0.5) F5(-1.5,0.5) F6(-0.5,0.5) F7(0.5,0.5) F8(1.5,0.5) F9(2.5,0.5) F10(3.5,0.5) F11(4.5,0.5) F12(5.5,0.5) G1(-5.5,-0.5) G2(-4.5,-0.5) G3(-3.5,-0.5) G4(-2.5,-0.5) G5(-1.5,-0.5) G6(-0.5,-0.5) G7(0.5,-0.5) G8(1.5,-0.5) G9(2.5,-0.5) G10(3.5,-0.5) G11(4.5,-0.5) G12(5.5,-0.5) H1(-5.5,-1.5) H2(-4.5,-1.5) H3(-3.5,-1.5) H4(-2.5,-1.5) H5(-1.5,-1.5) H6(-0.5,-1.5) H7(0.5,-1.5) H8(1.5,-1.5) H9(2.5,-1.5) H10(3.5,-1.5) H11(4.5,-1.5) H12(5.5,-1.5) J1(-5.5,-2.5) J2(-4.5,-2.5) J3(-3.5,-2.5) J4(-2.5,-2.5) J5(-1.5,-2.5) J6(-0.5,-2.5) J7(0.5,-2.5) J8(1.5,-2.5) J9(2.5,-2.5) J10(3.5,-2.5) J11(4.5,-2.5) J12(5.5,-2.5) K1(-5.5,-3.5) K2(-4.5,-3.5) K3(-3.5,-3.5) K4(-2.5,-3.5) K5(-1.5,-3.5) K6(-0.5,-3.5) K7(0.5,-3.5) K8(1.5,-3.5) K9(2.5,-3.5) K10(3.5,-3.5) K11(4.5,-3.5) K12(5.5,-3.5) L1(-5.5,-4.5) L2(-4.5,-4.5) L3(-3.5,-4.5) L4(-2.5,-4.5) L5(-1.5,-4.5) L6(-0.5,-4.5) L7(0.5,-4.5) L8(1.5,-4.5) L9(2.5,-4.5) L10(3.5,-4.5) L11(4.5,-4.5) L12(5.5,-4.5) M1(-5.5,-5.5) M2(-4.5,-5.5) M3(-3.5,-5.5) M4(-2.5,-5.5) M5(-1.5,-5.5) M6(-0.5,-5.5) M7(0.5,-5.5) M8(1.5,-5.5) M9(2.5,-5.5) M10(3.5,-5.5) M11(4.5,-5.5) M12(5.5,-5.5)
Top Overlay:
  circle w0.25: c-6.7,5.5 r0.125
  region: -6.1,6.1 -5.5,6.1 -6.1,5.5
  lines w0.2: -6.1,-6.1 6.1,-6.1 6.1,6.1 -6.1,6.1 -6.1,-6.1
Top Assy:
  circle w0.05: c-5,5 r0.5
  lines w0.05: -6,-6 -6,6 6,6 6,-6 -6,-6
  text ".Designator" at -3.443,-0.467 h2
Top Text:
  lines w0.05: -6.25,-6.25 -6.25,6.25 6.25,6.25 6.25,-6.25 -6.25,-6.25
  lines w0.1: -0.5,0 0.5,0 ; 0,-0.5 0,0.5
3D body "Y144AH.STEP": height 1.32, standoff -0.05, extent -6,-6 6,6